# Altium integrated library 860010374011_Altium_WCAP-ATG8_rev19a.IntLib: 195 symbols (part 1 of 2) (continued)
## 860010473008
designator C?, comment 120uF, 25V
WCAP-ATG8 THT Aluminum Electrolytic Capacitors, D6.3mm x L11mm, 120uF, +/-20%, 25VDC; Part Number: 860010473008; Dissipation Factor: 14%; Endurance: 2000h; Leakage Current: 30uA; Ripple Current max.: 253mA; Technical Reference: ATBD110121M025DSPA4B000; ComponentLink1Description: Manufacturer; ComponentLink1URL: http://www.we-online.de; ComponentLink2Description: Datasheet; ComponentLink2URL: https://katalog.we-online.com/pbs/datasheet/860010473008.pdf; Length: 11mm; Mounting Technology: THT; Operating Temperature: -40 to +85degC; Packaging: Ammo Pack; Published Date: August 2019; Capacitance: 120uF; Diameter: 6.3mm; Publisher: Wurth Elektronik; Capacitance Tolerance: +/-20%; Rated Voltage: 25VDC
footprint WCAP-ATG8_6.3x11
pins: 1 N, 2 P

## 860010473009
designator C?, comment 150uF, 25V
WCAP-ATG8 THT Aluminum Electrolytic Capacitors, D6.3mm x L11mm, 150uF, +/-20%, 25VDC; Part Number: 860010473009; Dissipation Factor: 14%; Endurance: 2000h; Leakage Current: 37.5uA; Ripple Current max.: 275mA; Technical Reference: ATBD110151M025DSPA4B000; ComponentLink1Description: Manufacturer; ComponentLink1URL: http://www.we-online.de; ComponentLink2Description: Datasheet; ComponentLink2URL: https://katalog.we-online.com/pbs/datasheet/860010473009.pdf; Length: 11mm; Mounting Technology: THT; Operating Temperature: -40 to +85degC; Packaging: Ammo Pack; Published Date: August 2019; Capacitance: 150uF; Diameter: 6.3mm; Publisher: Wurth Elektronik; Capacitance Tolerance: +/-20%; Rated Voltage: 25VDC
footprint WCAP-ATG8_6.3x11
pins: 1 N, 2 P

## 860010473010
designator C?, comment 180uF, 25V
WCAP-ATG8 THT Aluminum Electrolytic Capacitors, D6.3mm x L11mm, 180uF, +/-20%, 25VDC; Part Number: 860010473010; Dissipation Factor: 14%; Endurance: 2000h; Leakage Current: 45uA; Ripple Current max.: 280mA; Technical Reference: ATBD110181M025DSPA4B000; ComponentLink1Description: Manufacturer; ComponentLink1URL: http://www.we-online.de; ComponentLink2Description: Datasheet; ComponentLink2URL: https://katalog.we-online.com/pbs/datasheet/860010473010.pdf; Length: 11mm; Mounting Technology: THT; Operating Temperature: -40 to +85degC; Packaging: Ammo Pack; Published Date: August 2019; Capacitance: 180uF; Diameter: 6.3mm; Publisher: Wurth Elektronik; Capacitance Tolerance: +/-20%; Rated Voltage: 25VDC
footprint WCAP-ATG8_6.3x11
pins: 1 N, 2 P

## 860010473011
designator C?, comment 220uF, 25V
WCAP-ATG8 THT Aluminum Electrolytic Capacitors, D6.3mm x L11mm, 220uF, +/-20%, 25VDC; Part Number: 860010473011; Dissipation Factor: 14%; Endurance: 2000h; Leakage Current: 55uA; Ripple Current max.: 310mA; Technical Reference: ATBD110221M025DSPA4B000; ComponentLink1Description: Manufacturer; ComponentLink1URL: http://www.we-online.de; ComponentLink2Description: Datasheet; ComponentLink2URL: https://katalog.we-online.com/pbs/datasheet/860010473011.pdf; Length: 11mm; Mounting Technology: THT; Operating Temperature: -40 to +85degC; Packaging: Ammo Pack; Published Date: August 2019; Capacitance: 220uF; Diameter: 6.3mm; Publisher: Wurth Elektronik; Capacitance Tolerance: +/-20%; Rated Voltage: 25VDC
footprint WCAP-ATG8_6.3x11
pins: 1 N, 2 P

## 860010474012
designator C?, comment 330uF, 25V
WCAP-ATG8 THT Aluminum Electrolytic Capacitors, D8mm x L11.5mm, 330uF, +/-20%, 25VDC; Part Number: 860010474012; Dissipation Factor: 14%; Endurance: 2000h; Leakage Current: 82.5uA; Ripple Current max.: 451mA; Technical Reference: ATBE115331M025DSPA7B000; ComponentLink1Description: Manufacturer; ComponentLink1URL: http://www.we-online.de; ComponentLink2Description: Datasheet; ComponentLink2URL: https://katalog.we-online.com/pbs/datasheet/860010474012.pdf; Length: 11.5mm; Mounting Technology: THT; Operating Temperature: -40 to +85degC; Packaging: Ammo Pack; Published Date: August 2019; Capacitance: 330uF; Diameter: 8mm; Publisher: Wurth Elektronik; Capacitance Tolerance: +/-20%; Rated Voltage: 25VDC
footprint WCAP-ATG8_8x11.5
pins: 1 N, 2 P

## 860010474013
designator C?, comment 470uF, 25V
WCAP-ATG8 THT Aluminum Electrolytic Capacitors, D8mm x L11.5mm, 470uF, +/-20%, 25VDC; Part Number: 860010474013; Dissipation Factor: 14%; Endurance: 2000h; Leakage Current: 117.5uA; Ripple Current max.: 561mA; Technical Reference: ATBE115471M025DSPA7B000; ComponentLink1Description: Manufacturer; ComponentLink1URL: http://www.we-online.de; ComponentLink2Description: Datasheet; ComponentLink2URL: https://katalog.we-online.com/pbs/datasheet/860010474013.pdf; Length: 11.5mm; Mounting Technology: THT; Operating Temperature: -40 to +85degC; Packaging: Ammo Pack; Published Date: August 2019; Capacitance: 470uF; Diameter: 8mm; Publisher: Wurth Elektronik; Capacitance Tolerance: +/-20%; Rated Voltage: 25VDC
footprint WCAP-ATG8_8x11.5
pins: 1 N, 2 P

## 860010475014
designator C?, comment 560uF, 25V
WCAP-ATG8 THT Aluminum Electrolytic Capacitors, D10mm x L16mm, 560uF, +/-20%, 25VDC; Part Number: 860010475014; Dissipation Factor: 14%; Endurance: 2000h; Leakage Current: 140uA; Ripple Current max.: 693mA; Technical Reference: ATBF160561M025DSPAAB000; ComponentLink1Description: Manufacturer; ComponentLink1URL: http://www.we-online.de; ComponentLink2Description: Datasheet; ComponentLink2URL: https://katalog.we-online.com/pbs/datasheet/860010475014.pdf; Length: 16mm; Mounting Technology: THT; Operating Temperature: -40 to +85degC; Packaging: Ammo Pack; Published Date: August 2019; Capacitance: 560uF; Diameter: 10mm; Publisher: Wurth Elektronik; Capacitance Tolerance: +/-20%; Rated Voltage: 25VDC
footprint WCAP-ATG8_10x16
pins: 1 N, 2 P

## 860010475015
designator C?, comment 680uF, 25V
WCAP-ATG8 THT Aluminum Electrolytic Capacitors, D10mm x L16mm, 680uF, +/-20%, 25VDC; Part Number: 860010475015; Dissipation Factor: 14%; Endurance: 2000h; Leakage Current: 170uA; Ripple Current max.: 792mA; Technical Reference: ATBF160681M025DSPAAB000; ComponentLink1Description: Manufacturer; ComponentLink1URL: http://www.we-online.de; ComponentLink2Description: Datasheet; ComponentLink2URL: https://katalog.we-online.com/pbs/datasheet/860010475015.pdf; Length: 16mm; Mounting Technology: THT; Operating Temperature: -40 to +85degC; Packaging: Ammo Pack; Published Date: August 2019; Capacitance: 680uF; Diameter: 10mm; Publisher: Wurth Elektronik; Capacitance Tolerance: +/-20%; Rated Voltage: 25VDC
footprint WCAP-ATG8_10x16
pins: 1 N, 2 P

## 860010475016
designator C?, comment 820uF, 25V
WCAP-ATG8 THT Aluminum Electrolytic Capacitors, D10mm x L20mm, 820uF, +/-20%, 25VDC; Part Number: 860010475016; Dissipation Factor: 14%; Endurance: 2000h; Leakage Current: 205uA; Ripple Current max.: 891mA; Technical Reference: ATBF200821M025DSPAAB000; ComponentLink1Description: Manufacturer; ComponentLink1URL: http://www.we-online.de; ComponentLink2Description: Datasheet; ComponentLink2URL: https://katalog.we-online.com/pbs/datasheet/860010475016.pdf; Length: 20mm; Mounting Technology: THT; Operating Temperature: -40 to +85degC; Packaging: Ammo Pack; Published Date: August 2019; Capacitance: 820uF; Diameter: 10mm; Publisher: Wurth Elektronik; Capacitance Tolerance: +/-20%; Rated Voltage: 25VDC
footprint WCAP-ATG8_10x20
pins: 1 N, 2 P

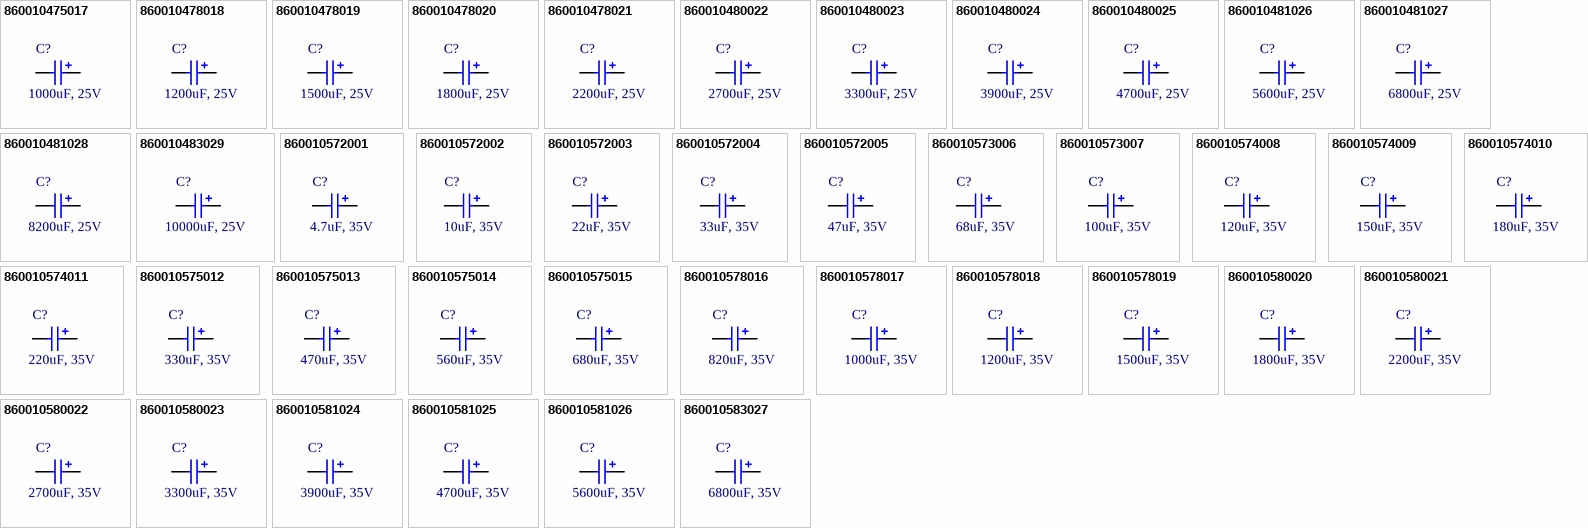
[diagram p2: symbols 860010475017 to 860010583027]

## 860010475017
designator C?, comment 1000uF, 25V
WCAP-ATG8 THT Aluminum Electrolytic Capacitors, D10mm x L20mm, 1000uF, +/-20%, 25VDC; Part Number: 860010475017; Dissipation Factor: 14%; Endurance: 2000h; Leakage Current: 250uA; Ripple Current max.: 1050mA; Technical Reference: ATBF200102M025DSPAAB000; ComponentLink1Description: Manufacturer; ComponentLink1URL: http://www.we-online.de; ComponentLink2Description: Datasheet; ComponentLink2URL: https://katalog.we-online.com/pbs/datasheet/860010475017.pdf; Length: 20mm; Mounting Technology: THT; Operating Temperature: -40 to +85degC; Packaging: Ammo Pack; Published Date: August 2019; Capacitance: 1000uF; Diameter: 10mm; Publisher: Wurth Elektronik; Capacitance Tolerance: +/-20%; Rated Voltage: 25VDC
footprint WCAP-ATG8_10x20
pins: 1 N, 2 P

## 860010478018
designator C?, comment 1200uF, 25V
WCAP-ATG8 THT Aluminum Electrolytic Capacitors, D13mm x L20mm, 1200uF, +/-20%, 25VDC; Part Number: 860010478018; Dissipation Factor: 14%; Endurance: 2000h; Leakage Current: 300uA; Ripple Current max.: 1155mA; Technical Reference: ATBI200122M025DSPACB000; ComponentLink1Description: Manufacturer; ComponentLink1URL: http://www.we-online.de; ComponentLink2Description: Datasheet; ComponentLink2URL: https://katalog.we-online.com/pbs/datasheet/860010478018.pdf; Length: 20mm; Mounting Technology: THT; Operating Temperature: -40 to +85degC; Packaging: Ammo Pack; Published Date: August 2019; Capacitance: 1200uF; Diameter: 13mm; Publisher: Wurth Elektronik; Capacitance Tolerance: +/-20%; Rated Voltage: 25VDC
footprint WCAP-ATG8_13x20
pins: 1 N, 2 P

## 860010478019
designator C?, comment 1500uF, 25V
WCAP-ATG8 THT Aluminum Electrolytic Capacitors, D13mm x L20mm, 1500uF, +/-20%, 25VDC; Part Number: 860010478019; Dissipation Factor: 14%; Endurance: 2000h; Leakage Current: 375uA; Ripple Current max.: 1353mA; Technical Reference: ATBI200152M025DSPACB000; ComponentLink1Description: Manufacturer; ComponentLink1URL: http://www.we-online.de; ComponentLink2Description: Datasheet; ComponentLink2URL: https://katalog.we-online.com/pbs/datasheet/860010478019.pdf; Length: 20mm; Mounting Technology: THT; Operating Temperature: -40 to +85degC; Packaging: Ammo Pack; Published Date: August 2019; Capacitance: 1500uF; Diameter: 13mm; Publisher: Wurth Elektronik; Capacitance Tolerance: +/-20%; Rated Voltage: 25VDC
footprint WCAP-ATG8_13x20
pins: 1 N, 2 P

## 860010478020
designator C?, comment 1800uF, 25V
WCAP-ATG8 THT Aluminum Electrolytic Capacitors, D13mm x L20mm, 1800uF, +/-20%, 25VDC; Part Number: 860010478020; Dissipation Factor: 14%; Endurance: 2000h; Leakage Current: 450uA; Ripple Current max.: 1496mA; Technical Reference: ATBI200182M025DSPACB000; ComponentLink1Description: Manufacturer; ComponentLink1URL: http://www.we-online.de; ComponentLink2Description: Datasheet; ComponentLink2URL: https://katalog.we-online.com/pbs/datasheet/860010478020.pdf; Length: 20mm; Mounting Technology: THT; Operating Temperature: -40 to +85degC; Packaging: Ammo Pack; Published Date: August 2019; Capacitance: 1800uF; Diameter: 13mm; Publisher: Wurth Elektronik; Capacitance Tolerance: +/-20%; Rated Voltage: 25VDC
footprint WCAP-ATG8_13x20
pins: 1 N, 2 P

## 860010478021
designator C?, comment 2200uF, 25V
WCAP-ATG8 THT Aluminum Electrolytic Capacitors, D13mm x L25mm, 2200uF, +/-20%, 25VDC; Part Number: 860010478021; Dissipation Factor: 16%; Endurance: 2000h; Leakage Current: 550uA; Ripple Current max.: 1705mA; Technical Reference: ATBI250222M025DSPACB000; ComponentLink1Description: Manufacturer; ComponentLink1URL: http://www.we-online.de; ComponentLink2Description: Datasheet; ComponentLink2URL: https://katalog.we-online.com/pbs/datasheet/860010478021.pdf; Length: 25mm; Mounting Technology: THT; Operating Temperature: -40 to +85degC; Packaging: Ammo Pack; Published Date: August 2019; Capacitance: 2200uF; Diameter: 13mm; Publisher: Wurth Elektronik; Capacitance Tolerance: +/-20%; Rated Voltage: 25VDC
footprint WCAP-ATG8_13x25
pins: 1 N, 2 P

## 860010480022
designator C?, comment 2700uF, 25V
WCAP-ATG8 THT Aluminum Electrolytic Capacitors, D16mm x L25mm, 2700uF, +/-20%, 25VDC; Part Number: 860010480022; Dissipation Factor: 16%; Endurance: 2000h; Leakage Current: 675uA; Ripple Current max.: 1804mA; Technical Reference: ATBK250272M025DSPAEB000; ComponentLink1Description: Manufacturer; ComponentLink1URL: http://www.we-online.de; ComponentLink2Description: Datasheet; ComponentLink2URL: https://katalog.we-online.com/pbs/datasheet/860010480022.pdf; Length: 25mm; Mounting Technology: THT; Operating Temperature: -40 to +85degC; Packaging: Ammo Pack; Published Date: August 2019; Capacitance: 2700uF; Diameter: 16mm; Publisher: Wurth Elektronik; Capacitance Tolerance: +/-20%; Rated Voltage: 25VDC
footprint WCAP-ATG8_16x25
pins: 1 N, 2 P

## 860010480023
designator C?, comment 3300uF, 25V
WCAP-ATG8 THT Aluminum Electrolytic Capacitors, D16mm x L25mm, 3300uF, +/-20%, 25VDC; Part Number: 860010480023; Dissipation Factor: 18%; Endurance: 2000h; Leakage Current: 825uA; Ripple Current max.: 1870mA; Technical Reference: ATBK250332M025DSPAEB000; ComponentLink1Description: Manufacturer; ComponentLink1URL: http://www.we-online.de; ComponentLink2Description: Datasheet; ComponentLink2URL: https://katalog.we-online.com/pbs/datasheet/860010480023.pdf; Length: 25mm; Mounting Technology: THT; Operating Temperature: -40 to +85degC; Packaging: Ammo Pack; Published Date: August 2019; Capacitance: 3300uF; Diameter: 16mm; Publisher: Wurth Elektronik; Capacitance Tolerance: +/-20%; Rated Voltage: 25VDC
footprint WCAP-ATG8_16x25
pins: 1 N, 2 P

## 860010480024
designator C?, comment 3900uF, 25V
WCAP-ATG8 THT Aluminum Electrolytic Capacitors, D16mm x L31.5mm, 3900uF, +/-20%, 25VDC; Part Number: 860010480024; Dissipation Factor: 18%; Endurance: 2000h; Leakage Current: 975uA; Ripple Current max.: 2343mA; Technical Reference: ATBK315392M025DSPADB000; ComponentLink1Description: Manufacturer; ComponentLink1URL: http://www.we-online.de; ComponentLink2Description: Datasheet; ComponentLink2URL: https://katalog.we-online.com/pbs/datasheet/860010480024.pdf; Length: 31.5mm; Mounting Technology: THT; Operating Temperature: -40 to +85degC; Packaging: Ammo Pack; Published Date: August 2019; Capacitance: 3900uF; Diameter: 16mm; Publisher: Wurth Elektronik; Capacitance Tolerance: +/-20%; Rated Voltage: 25VDC
footprint WCAP-ATG8_16x31.5
pins: 1 N, 2 P

## 860010480025
designator C?, comment 4700uF, 25V
WCAP-ATG8 THT Aluminum Electrolytic Capacitors, D16mm x L31.5mm, 4700uF, +/-20%, 25VDC; Part Number: 860010480025; Dissipation Factor: 20%; Endurance: 2000h; Leakage Current: 1175uA; Ripple Current max.: 2640mA; Technical Reference: ATBK315472M025DSPADB000; ComponentLink1Description: Manufacturer; ComponentLink1URL: http://www.we-online.de; ComponentLink2Description: Datasheet; ComponentLink2URL: https://katalog.we-online.com/pbs/datasheet/860010480025.pdf; Length: 31.5mm; Mounting Technology: THT; Operating Temperature: -40 to +85degC; Packaging: Ammo Pack; Published Date: August 2019; Capacitance: 4700uF; Diameter: 16mm; Publisher: Wurth Elektronik; Capacitance Tolerance: +/-20%; Rated Voltage: 25VDC
footprint WCAP-ATG8_16x31.5
pins: 1 N, 2 P

## 860010481026
designator C?, comment 5600uF, 25V
WCAP-ATG8 THT Aluminum Electrolytic Capacitors, D18mm x L31.5mm, 5600uF, +/-20%, 25VDC; Part Number: 860010481026; Dissipation Factor: 22%; Endurance: 2000h; Leakage Current: 1400uA; Ripple Current max.: 2816mA; Technical Reference: ATBL315562M025DSPAEB000; ComponentLink1Description: Manufacturer; ComponentLink1URL: http://www.we-online.de; ComponentLink2Description: Datasheet; ComponentLink2URL: https://katalog.we-online.com/pbs/datasheet/860010481026.pdf; Length: 31.5mm; Mounting Technology: THT; Operating Temperature: -40 to +85degC; Packaging: Ammo Pack; Published Date: August 2019; Capacitance: 5600uF; Diameter: 18mm; Publisher: Wurth Elektronik; Capacitance Tolerance: +/-20%; Rated Voltage: 25VDC
footprint WCAP-ATG8_18x31.5
pins: 1 N, 2 P

## 860010481027
designator C?, comment 6800uF, 25V
WCAP-ATG8 THT Aluminum Electrolytic Capacitors, D18mm x L35.5mm, 6800uF, +/-20%, 25VDC; Part Number: 860010481027; Dissipation Factor: 24%; Endurance: 2000h; Leakage Current: 1700uA; Ripple Current max.: 2970mA; Technical Reference: ATBL355682M025DSPAEB000; ComponentLink1Description: Manufacturer; ComponentLink1URL: http://www.we-online.de; ComponentLink2Description: Datasheet; ComponentLink2URL: https://katalog.we-online.com/pbs/datasheet/860010481027.pdf; Length: 35.5mm; Mounting Technology: THT; Operating Temperature: -40 to +85degC; Packaging: Ammo Pack; Published Date: August 2019; Capacitance: 6800uF; Diameter: 18mm; Publisher: Wurth Elektronik; Capacitance Tolerance: +/-20%; Rated Voltage: 25VDC
footprint WCAP-ATG8_18x35.5
pins: 1 N, 2 P

## 860010481028
designator C?, comment 8200uF, 25V
WCAP-ATG8 THT Aluminum Electrolytic Capacitors, D18mm x L35.5mm, 8200uF, +/-20%, 25VDC; Part Number: 860010481028; Dissipation Factor: 28%; Endurance: 2000h; Leakage Current: 2050uA; Ripple Current max.: 2981mA; Technical Reference: ATBL355822M025DSPAEB000; ComponentLink1Description: Manufacturer; ComponentLink1URL: http://www.we-online.de; ComponentLink2Description: Datasheet; ComponentLink2URL: https://katalog.we-online.com/pbs/datasheet/860010481028.pdf; Length: 35.5mm; Mounting Technology: THT; Operating Temperature: -40 to +85degC; Packaging: Ammo Pack; Published Date: August 2019; Capacitance: 8200uF; Diameter: 18mm; Publisher: Wurth Elektronik; Capacitance Tolerance: +/-20%; Rated Voltage: 25VDC
footprint WCAP-ATG8_18x35.5
pins: 1 N, 2 P

## 860010483029
designator C?, comment 10000uF, 25V
WCAP-ATG8 THT Aluminum Electrolytic Capacitors, D22mm x L41mm, 10000uF, +/-20%, 25VDC; Part Number: 860010483029; Dissipation Factor: 32%; Endurance: 2000h; Leakage Current: 2500uA; Ripple Current max.: 3960mA; Technical Reference: ATBN410103M025DSPS2B000; ComponentLink1Description: Manufacturer; ComponentLink1URL: http://www.we-online.de; ComponentLink2Description: Datasheet; ComponentLink2URL: https://katalog.we-online.com/pbs/datasheet/860010483029.pdf; Length: 41mm; Mounting Technology: THT; Operating Temperature: -40 to +85degC; Packaging: Ammo Pack; Published Date: August 2019; Capacitance: 10000uF; Diameter: 22mm; Publisher: Wurth Elektronik; Capacitance Tolerance: +/-20%; Rated Voltage: 25VDC
footprint WCAP-ATG8_22x41
pins: 1 N, 2 P

## 860010572001
designator C?, comment 4.7uF, 35V
WCAP-ATG8 THT Aluminum Electrolytic Capacitors, D5mm x L11mm, 4.7uF, +/-20%, 35VDC; Part Number: 860010572001; Dissipation Factor: 12%; Endurance: 2000h; Leakage Current: 3uA; Ripple Current max.: 44mA; Technical Reference: ATBC1104R7M035DSPA3B000; ComponentLink1Description: Manufacturer; ComponentLink1URL: http://www.we-online.de; ComponentLink2Description: Datasheet; ComponentLink2URL: https://katalog.we-online.com/pbs/datasheet/860010572001.pdf; Length: 11mm; Mounting Technology: THT; Operating Temperature: -40 to +85degC; Packaging: Ammo Pack; Published Date: August 2019; Capacitance: 4.7uF; Diameter: 5mm; Publisher: Wurth Elektronik; Capacitance Tolerance: +/-20%; Rated Voltage: 35VDC
footprint WCAP-ATG8_5x11
pins: 1 N, 2 P

## 860010572002
designator C?, comment 10uF, 35V
WCAP-ATG8 THT Aluminum Electrolytic Capacitors, D5mm x L11mm, 10uF, +/-20%, 35VDC; Part Number: 860010572002; Dissipation Factor: 12%; Endurance: 2000h; Leakage Current: 3.5uA; Ripple Current max.: 66mA; Technical Reference: ATBC110100M035DSPA3B000; ComponentLink1Description: Manufacturer; ComponentLink1URL: http://www.we-online.de; ComponentLink2Description: Datasheet; ComponentLink2URL: https://katalog.we-online.com/pbs/datasheet/860010572002.pdf; Length: 11mm; Mounting Technology: THT; Operating Temperature: -40 to +85degC; Packaging: Ammo Pack; Published Date: August 2019; Capacitance: 10uF; Diameter: 5mm; Publisher: Wurth Elektronik; Capacitance Tolerance: +/-20%; Rated Voltage: 35VDC
footprint WCAP-ATG8_5x11
pins: 1 N, 2 P

## 860010572003
designator C?, comment 22uF, 35V
WCAP-ATG8 THT Aluminum Electrolytic Capacitors, D5mm x L11mm, 22uF, +/-20%, 35VDC; Part Number: 860010572003; Dissipation Factor: 12%; Endurance: 2000h; Leakage Current: 7.7uA; Ripple Current max.: 108mA; Technical Reference: ATBC110220M035DSPA3B000; ComponentLink1Description: Manufacturer; ComponentLink1URL: http://www.we-online.de; ComponentLink2Description: Datasheet; ComponentLink2URL: https://katalog.we-online.com/pbs/datasheet/860010572003.pdf; Length: 11mm; Mounting Technology: THT; Operating Temperature: -40 to +85degC; Packaging: Ammo Pack; Published Date: August 2019; Capacitance: 22uF; Diameter: 5mm; Publisher: Wurth Elektronik; Capacitance Tolerance: +/-20%; Rated Voltage: 35VDC
footprint WCAP-ATG8_5x11
pins: 1 N, 2 P

## 860010572004
designator C?, comment 33uF, 35V
WCAP-ATG8 THT Aluminum Electrolytic Capacitors, D5mm x L11mm, 33uF, +/-20%, 35VDC; Part Number: 860010572004; Dissipation Factor: 12%; Endurance: 2000h; Leakage Current: 11.55uA; Ripple Current max.: 121mA; Technical Reference: ATBC110330M035DSPA3B000; ComponentLink1Description: Manufacturer; ComponentLink1URL: http://www.we-online.de; ComponentLink2Description: Datasheet; ComponentLink2URL: https://katalog.we-online.com/pbs/datasheet/860010572004.pdf; Length: 11mm; Mounting Technology: THT; Operating Temperature: -40 to +85degC; Packaging: Ammo Pack; Published Date: August 2019; Capacitance: 33uF; Diameter: 5mm; Publisher: Wurth Elektronik; Capacitance Tolerance: +/-20%; Rated Voltage: 35VDC
footprint WCAP-ATG8_5x11
pins: 1 N, 2 P

## 860010572005
designator C?, comment 47uF, 35V
WCAP-ATG8 THT Aluminum Electrolytic Capacitors, D5mm x L11mm, 47uF, +/-20%, 35VDC; Part Number: 860010572005; Dissipation Factor: 12%; Endurance: 2000h; Leakage Current: 16.45uA; Ripple Current max.: 143mA; Technical Reference: ATBC110470M035DSPA3B000; ComponentLink1Description: Manufacturer; ComponentLink1URL: http://www.we-online.de; ComponentLink2Description: Datasheet; ComponentLink2URL: https://katalog.we-online.com/pbs/datasheet/860010572005.pdf; Length: 11mm; Mounting Technology: THT; Operating Temperature: -40 to +85degC; Packaging: Ammo Pack; Published Date: August 2019; Capacitance: 47uF; Diameter: 5mm; Publisher: Wurth Elektronik; Capacitance Tolerance: +/-20%; Rated Voltage: 35VDC
footprint WCAP-ATG8_5x11
pins: 1 N, 2 P

## 860010573006
designator C?, comment 68uF, 35V
WCAP-ATG8 THT Aluminum Electrolytic Capacitors, D6.3mm x L11mm, 68uF, +/-20%, 35VDC; Part Number: 860010573006; Dissipation Factor: 12%; Endurance: 2000h; Leakage Current: 23.8uA; Ripple Current max.: 198mA; Technical Reference: ATBD110680M035DSPA4B000; ComponentLink1Description: Manufacturer; ComponentLink1URL: http://www.we-online.de; ComponentLink2Description: Datasheet; ComponentLink2URL: https://katalog.we-online.com/pbs/datasheet/860010573006.pdf; Length: 11mm; Mounting Technology: THT; Operating Temperature: -40 to +85degC; Packaging: Ammo Pack; Published Date: August 2019; Capacitance: 68uF; Diameter: 6.3mm; Publisher: Wurth Elektronik; Capacitance Tolerance: +/-20%; Rated Voltage: 35VDC
footprint WCAP-ATG8_6.3x11
pins: 1 N, 2 P

## 860010573007
designator C?, comment 100uF, 35V
WCAP-ATG8 THT Aluminum Electrolytic Capacitors, D6.3mm x L11mm, 100uF, +/-20%, 35VDC; Part Number: 860010573007; Dissipation Factor: 12%; Endurance: 2000h; Leakage Current: 35uA; Ripple Current max.: 231mA; Technical Reference: ATBD110101M035DSPA4B000; ComponentLink1Description: Manufacturer; ComponentLink1URL: http://www.we-online.de; ComponentLink2Description: Datasheet; ComponentLink2URL: https://katalog.we-online.com/pbs/datasheet/860010573007.pdf; Length: 11mm; Mounting Technology: THT; Operating Temperature: -40 to +85degC; Packaging: Ammo Pack; Published Date: August 2019; Capacitance: 100uF; Diameter: 6.3mm; Publisher: Wurth Elektronik; Capacitance Tolerance: +/-20%; Rated Voltage: 35VDC
footprint WCAP-ATG8_6.3x11
pins: 1 N, 2 P

## 860010574008
designator C?, comment 120uF, 35V
WCAP-ATG8 THT Aluminum Electrolytic Capacitors, D8mm x L11.5mm, 120uF, +/-20%, 35VDC; Part Number: 860010574008; Dissipation Factor: 12%; Endurance: 2000h; Leakage Current: 42uA; Ripple Current max.: 275mA; Technical Reference: ATBE115121M035DSPA7B000; ComponentLink1Description: Manufacturer; ComponentLink1URL: http://www.we-online.de; ComponentLink2Description: Datasheet; ComponentLink2URL: https://katalog.we-online.com/pbs/datasheet/860010574008.pdf; Length: 11.5mm; Mounting Technology: THT; Operating Temperature: -40 to +85degC; Packaging: Ammo Pack; Published Date: August 2019; Capacitance: 120uF; Diameter: 8mm; Publisher: Wurth Elektronik; Capacitance Tolerance: +/-20%; Rated Voltage: 35VDC
footprint WCAP-ATG8_8x11.5
pins: 1 N, 2 P

## 860010574009
designator C?, comment 150uF, 35V
WCAP-ATG8 THT Aluminum Electrolytic Capacitors, D8mm x L11.5mm, 150uF, +/-20%, 35VDC; Part Number: 860010574009; Dissipation Factor: 12%; Endurance: 2000h; Leakage Current: 52.5uA; Ripple Current max.: 308mA; Technical Reference: ATBE115151M035DSPA7B000; ComponentLink1Description: Manufacturer; ComponentLink1URL: http://www.we-online.de; ComponentLink2Description: Datasheet; ComponentLink2URL: https://katalog.we-online.com/pbs/datasheet/860010574009.pdf; Length: 11.5mm; Mounting Technology: THT; Operating Temperature: -40 to +85degC; Packaging: Ammo Pack; Published Date: August 2019; Capacitance: 150uF; Diameter: 8mm; Publisher: Wurth Elektronik; Capacitance Tolerance: +/-20%; Rated Voltage: 35VDC
footprint WCAP-ATG8_8x11.5
pins: 1 N, 2 P

## 860010574010
designator C?, comment 180uF, 35V
WCAP-ATG8 THT Aluminum Electrolytic Capacitors, D8mm x L11.5mm, 180uF, +/-20%, 35VDC; Part Number: 860010574010; Dissipation Factor: 12%; Endurance: 2000h; Leakage Current: 63uA; Ripple Current max.: 352mA; Technical Reference: ATBE115181M035DSPA7B000; ComponentLink1Description: Manufacturer; ComponentLink1URL: http://www.we-online.de; ComponentLink2Description: Datasheet; ComponentLink2URL: https://katalog.we-online.com/pbs/datasheet/860010574010.pdf; Length: 11.5mm; Mounting Technology: THT; Operating Temperature: -40 to +85degC; Packaging: Ammo Pack; Published Date: August 2019; Capacitance: 180uF; Diameter: 8mm; Publisher: Wurth Elektronik; Capacitance Tolerance: +/-20%; Rated Voltage: 35VDC
footprint WCAP-ATG8_8x11.5
pins: 1 N, 2 P

## 860010574011
designator C?, comment 220uF, 35V
WCAP-ATG8 THT Aluminum Electrolytic Capacitors, D8mm x L11.5mm, 220uF, +/-20%, 35VDC; Part Number: 860010574011; Dissipation Factor: 12%; Endurance: 2000h; Leakage Current: 77uA; Ripple Current max.: 385mA; Technical Reference: ATBE115221M035DSPA7B000; ComponentLink1Description: Manufacturer; ComponentLink1URL: http://www.we-online.de; ComponentLink2Description: Datasheet; ComponentLink2URL: https://katalog.we-online.com/pbs/datasheet/860010574011.pdf; Length: 11.5mm; Mounting Technology: THT; Operating Temperature: -40 to +85degC; Packaging: Ammo Pack; Published Date: August 2019; Capacitance: 220uF; Diameter: 8mm; Publisher: Wurth Elektronik; Capacitance Tolerance: +/-20%; Rated Voltage: 35VDC
footprint WCAP-ATG8_8x11.5
pins: 1 N, 2 P

## 860010575012
designator C?, comment 330uF, 35V
WCAP-ATG8 THT Aluminum Electrolytic Capacitors, D10mm x L12.5mm, 330uF, +/-20%, 35VDC; Part Number: 860010575012; Dissipation Factor: 12%; Endurance: 2000h; Leakage Current: 115.5uA; Ripple Current max.: 528mA; Technical Reference: ATBF125331M035DSPA9B000; ComponentLink1Description: Manufacturer; ComponentLink1URL: http://www.we-online.de; ComponentLink2Description: Datasheet; ComponentLink2URL: https://katalog.we-online.com/pbs/datasheet/860010575012.pdf; Length: 12.5mm; Mounting Technology: THT; Operating Temperature: -40 to +85degC; Packaging: Ammo Pack; Published Date: August 2019; Capacitance: 330uF; Diameter: 10mm; Publisher: Wurth Elektronik; Capacitance Tolerance: +/-20%; Rated Voltage: 35VDC
footprint WCAP-ATG8_10x12.5
pins: 1 N, 2 P

## 860010575013
designator C?, comment 470uF, 35V
WCAP-ATG8 THT Aluminum Electrolytic Capacitors, D10mm x L16mm, 470uF, +/-20%, 35VDC; Part Number: 860010575013; Dissipation Factor: 12%; Endurance: 2000h; Leakage Current: 164.5uA; Ripple Current max.: 693mA; Technical Reference: ATBF160471M035DSPAAB000; ComponentLink1Description: Manufacturer; ComponentLink1URL: http://www.we-online.de; ComponentLink2Description: Datasheet; ComponentLink2URL: https://katalog.we-online.com/pbs/datasheet/860010575013.pdf; Length: 16mm; Mounting Technology: THT; Operating Temperature: -40 to +85degC; Packaging: Ammo Pack; Published Date: August 2019; Capacitance: 470uF; Diameter: 10mm; Publisher: Wurth Elektronik; Capacitance Tolerance: +/-20%; Rated Voltage: 35VDC
footprint WCAP-ATG8_10x16
pins: 1 N, 2 P
